# Altium integrated library Altium_Library_Harish.IntLib: 425 symbols (part 1 of 4) (continued)
## CAP_NOT-MOUNTED_0201
designator C?, comment DNP  (no BOM)
Do Not Place this Capacitor 0201; Manufacturer: KEMET; Manufacturer Part Number: C0603C103K8RACTU; Dielectric Material: Ceramic; Capacitance: 10nF; Tolerance: 10%; Voltage Rating: 10V; Dielectric: X7R; Dissipation Factor: 5%; Case/Package: 0603; Supplier-1: Digikey; Supplier 1: Mouser; Manufacturer 1: KEMET; Manufacturer Part Number 1: C0603C103K8RACTU; RoHS: Yes; Category: Ceramic Capacitors; Stock 1: 6134; Pricing 1: 1=0.1, 10=0.034, 50=0.034, 100=0.02, 1000=0.016, 10000=0.011 (USD); Mount: Surface Mount; Case Code (Metric): 1608; Case Code (Imperial): 0603; Min Operating Temperature: -55°C; Max Operating Temperature: 125°C; Package Quantity: 1; Packaging: Tape and Reel; Voltage Rating (DC): 10V; Termination: SMD/SMT; Series: -; Construction: Flat; Length: 1.6mm; Width: 0.031inch; Height: 0.8mm; Thickness: 0.034inch; Lead Pitch: 0.7mm; Depth: 0.8mm; Reach SVHC Compliant: No; ComponentLink1URL: https://datasheet.ciiva.com/49516/1564916-49516523.pdf?src-supplier=Jameco; ComponentLink1Description: https://datasheet.ciiva.com/49516/1564916-49516523.pdf?src-supplier=Jameco; Supplier Part Number 1: 80-C0603C103K8R
footprint CAP_0201
pins: 1, 2

## CAP_NOT-MOUNTED_0402
designator C?, comment DNP  (no BOM)
Do Not Place this Capacitor 0402; Manufacturer: KEMET; Manufacturer Part Number: C0603C103K8RACTU; Dielectric Material: Ceramic; Capacitance: 10nF; Tolerance: 10%; Voltage Rating: 10V; Dielectric: X7R; Dissipation Factor: 5%; Case/Package: 0603; Supplier-1: Digikey; Supplier 1: Mouser; Manufacturer 1: KEMET; Manufacturer Part Number 1: C0603C103K8RACTU; RoHS: Yes; Category: Ceramic Capacitors; Stock 1: 6134; Pricing 1: 1=0.1, 10=0.034, 50=0.034, 100=0.02, 1000=0.016, 10000=0.011 (USD); Mount: Surface Mount; Case Code (Metric): 1608; Case Code (Imperial): 0603; Min Operating Temperature: -55°C; Max Operating Temperature: 125°C; Package Quantity: 1; Packaging: Tape and Reel; Voltage Rating (DC): 10V; Termination: SMD/SMT; Series: -; Construction: Flat; Length: 1.6mm; Width: 0.031inch; Height: 0.8mm; Thickness: 0.034inch; Lead Pitch: 0.7mm; Depth: 0.8mm; Reach SVHC Compliant: No; ComponentLink1URL: https://datasheet.ciiva.com/49516/1564916-49516523.pdf?src-supplier=Jameco; ComponentLink1Description: https://datasheet.ciiva.com/49516/1564916-49516523.pdf?src-supplier=Jameco; Supplier Part Number 1: 80-C0603C103K8R
footprint CAP_0402
pins: 1, 2

## CAP_NOT-MOUNTED_0603
designator C?, comment DNP  (no BOM)
Do Not Place this Capacitor 0603; Manufacturer: KEMET; Manufacturer Part Number: C0603C103K8RACTU; Dielectric Material: Ceramic; Capacitance: 10nF; Tolerance: 10%; Voltage Rating: 10V; Dielectric: X7R; Dissipation Factor: 5%; Case/Package: 0603; Supplier-1: Digikey; Supplier 1: Mouser; Manufacturer 1: KEMET; Manufacturer Part Number 1: C0603C103K8RACTU; RoHS: Yes; Category: Ceramic Capacitors; Stock 1: 6134; Pricing 1: 1=0.1, 10=0.034, 50=0.034, 100=0.02, 1000=0.016, 10000=0.011 (USD); Mount: Surface Mount; Case Code (Metric): 1608; Case Code (Imperial): 0603; Min Operating Temperature: -55°C; Max Operating Temperature: 125°C; Package Quantity: 1; Packaging: Tape and Reel; Voltage Rating (DC): 10V; Termination: SMD/SMT; Series: -; Construction: Flat; Length: 1.6mm; Width: 0.031inch; Height: 0.8mm; Thickness: 0.034inch; Lead Pitch: 0.7mm; Depth: 0.8mm; Reach SVHC Compliant: No; ComponentLink1URL: https://datasheet.ciiva.com/49516/1564916-49516523.pdf?src-supplier=Jameco; ComponentLink1Description: https://datasheet.ciiva.com/49516/1564916-49516523.pdf?src-supplier=Jameco; Supplier Part Number 1: 80-C0603C103K8R
footprint CAP_0603
pins: 1, 2

## CAP_NOT-MOUNTED_0805
designator C?, comment DNP  (no BOM)
Do Not Place this Capacitor 0805; Manufacturer: KEMET; Manufacturer Part Number: C0603C103K8RACTU; Dielectric Material: Ceramic; Capacitance: 10nF; Tolerance: 10%; Voltage Rating: 10V; Dielectric: X7R; Dissipation Factor: 5%; Case/Package: 0603; Supplier-1: Digikey; Supplier 1: Mouser; Manufacturer 1: KEMET; Manufacturer Part Number 1: C0603C103K8RACTU; RoHS: Yes; Category: Ceramic Capacitors; Stock 1: 6134; Pricing 1: 1=0.1, 10=0.034, 50=0.034, 100=0.02, 1000=0.016, 10000=0.011 (USD); Mount: Surface Mount; Case Code (Metric): 1608; Case Code (Imperial): 0603; Min Operating Temperature: -55°C; Max Operating Temperature: 125°C; Package Quantity: 1; Packaging: Tape and Reel; Voltage Rating (DC): 10V; Termination: SMD/SMT; Series: -; Construction: Flat; Length: 1.6mm; Width: 0.031inch; Height: 0.8mm; Thickness: 0.034inch; Lead Pitch: 0.7mm; Depth: 0.8mm; Reach SVHC Compliant: No; ComponentLink1URL: https://datasheet.ciiva.com/49516/1564916-49516523.pdf?src-supplier=Jameco; ComponentLink1Description: https://datasheet.ciiva.com/49516/1564916-49516523.pdf?src-supplier=Jameco; Supplier Part Number 1: 80-C0603C103K8R
footprint CAP_0805
pins: 1, 2

## CAP_NOT-MOUNTED_1206
designator C?, comment DNP  (no BOM)
Do Not Place this Capacitor 1206; Manufacturer: KEMET; Manufacturer Part Number: C0603C103K8RACTU; Dielectric Material: Ceramic; Capacitance: 10nF; Tolerance: 10%; Voltage Rating: 10V; Dielectric: X7R; Dissipation Factor: 5%; Case/Package: 0603; Supplier-1: Digikey; Supplier 1: Mouser; Manufacturer 1: KEMET; Manufacturer Part Number 1: C0603C103K8RACTU; RoHS: Yes; Category: Ceramic Capacitors; Stock 1: 6134; Pricing 1: 1=0.1, 10=0.034, 50=0.034, 100=0.02, 1000=0.016, 10000=0.011 (USD); Mount: Surface Mount; Case Code (Metric): 1608; Case Code (Imperial): 0603; Min Operating Temperature: -55°C; Max Operating Temperature: 125°C; Package Quantity: 1; Packaging: Tape and Reel; Voltage Rating (DC): 10V; Termination: SMD/SMT; Series: -; Construction: Flat; Length: 1.6mm; Width: 0.031inch; Height: 0.8mm; Thickness: 0.034inch; Lead Pitch: 0.7mm; Depth: 0.8mm; Reach SVHC Compliant: No; ComponentLink1URL: https://datasheet.ciiva.com/49516/1564916-49516523.pdf?src-supplier=Jameco; ComponentLink1Description: https://datasheet.ciiva.com/49516/1564916-49516523.pdf?src-supplier=Jameco; Supplier Part Number 1: 80-C0603C103K8R
footprint CAP_1206
pins: 1, 2

## CAP_NOT-MOUNTED_1210
designator C?, comment DNP  (no BOM)
Do Not Place this Capacitor 1210; Manufacturer: KEMET; Manufacturer Part Number: C0603C103K8RACTU; Dielectric Material: Ceramic; Capacitance: 10nF; Tolerance: 10%; Voltage Rating: 10V; Dielectric: X7R; Dissipation Factor: 5%; Case/Package: 0603; Supplier-1: Digikey; Supplier 1: Mouser; Manufacturer 1: KEMET; Manufacturer Part Number 1: C0603C103K8RACTU; RoHS: Yes; Category: Ceramic Capacitors; Stock 1: 6134; Pricing 1: 1=0.1, 10=0.034, 50=0.034, 100=0.02, 1000=0.016, 10000=0.011 (USD); Mount: Surface Mount; Case Code (Metric): 1608; Case Code (Imperial): 0603; Min Operating Temperature: -55°C; Max Operating Temperature: 125°C; Package Quantity: 1; Packaging: Tape and Reel; Voltage Rating (DC): 10V; Termination: SMD/SMT; Series: -; Construction: Flat; Length: 1.6mm; Width: 0.031inch; Height: 0.8mm; Thickness: 0.034inch; Lead Pitch: 0.7mm; Depth: 0.8mm; Reach SVHC Compliant: No; ComponentLink1URL: https://datasheet.ciiva.com/49516/1564916-49516523.pdf?src-supplier=Jameco; ComponentLink1Description: https://datasheet.ciiva.com/49516/1564916-49516523.pdf?src-supplier=Jameco; Supplier Part Number 1: 80-C0603C103K8R
footprint CAP_1210
pins: 1, 2

## COM_MSIM_7POS_CUI
designator J?, comment MSIM-1-A
Memory Card Connectors 7 Positions, Push In, Auto Eject Out, SMT, 1.37 mm Height Above Board,; ComponentLink1Description: LCSC Link; ComponentLink1URL: https://www.lcsc.com/product-detail/SIM-Card-Connectors_SHOU-HAN-MICRO-SIM-7P-H1-35_C7529381.html
footprint CON_MSIM_7POS (MSIM-1-A)
pins: 1 VCC, 2 RST, 3 CLK, 5 GND, 6 VPP, 7 I/O, 8 CD, 9 GND

## CON_ED_2_1mm_SMD Molex - 202396-0207
designator J?, comment 202396-0207  (value not drawn)
Conn Shrouded Header (4 Sides) HDR 2 POS 1mm Solder RA Side Entry SMD Pico-Clasp™ T/R; Manufacturer: Molex; Supplier 1: Mouser; Manufacturer Part Number: 202396-0207; RoHS: No; Category: Headers and Wire Housings; Stock 1: 10886; Pricing 1: 1=0.97, 10=0.804, 50=0.804, 100=0.664, 1000=0.63, 10000=0.435 (USD); ComponentLink1URL: http://datasheet.octopart.com/2023960207-Molex-datasheet-147952241.pdf?src-supplier=Avnet; ComponentLink1Description: http://datasheet.octopart.com/2023960207-Molex-datasheet-147952241.pdf?src-supplier=Avnet; ComponentLink2URL: http://datasheet.octopart.com/2023960207-Molex-datasheet-147952241.pdf?src-supplier=Farnell; ComponentLink2Description: http://datasheet.octopart.com/2023960207-Molex-datasheet-147952241.pdf?src-supplier=Farnell; ComponentLink3URL: http://datasheet.octopart.com/2023960207-Molex-datasheet-147952241.pdf?src-supplier=Digi-Key; ComponentLink3Description: http://datasheet.octopart.com/2023960207-Molex-datasheet-147952241.pdf?src-supplier=Digi-Key; ComponentLink4URL: https://www.molex.com/pdm_docs/sd/2023960207_sd.pdf?src-supplier=Digi-Key; ComponentLink4Description: https://www.molex.com/pdm_docs/sd/2023960207_sd.pdf?src-supplier=Digi-Key; ComponentLink5URL: http://datasheet.octopart.com/2023960207-Molex-datasheet-147952241.pdf?src-supplier=Arrow+Electronics; ComponentLink5Description: http://datasheet.octopart.com/2023960207-Molex-datasheet-147952241.pdf?src-supplier=Arrow+Electronics; ComponentLink6URL: http://datasheet.octopart.com/2023960207-Molex-datasheet-147952241.pdf?src-supplier=Newark; ComponentLink6Description: http://datasheet.octopart.com/2023960207-Molex-datasheet-147952241.pdf?src-supplier=Newark; ComponentLink7URL: https://datasheet.octopart.com/202396-0207-Molex-datasheet-134623761.pdf?src-supplier=TME; ComponentLink7Description: https://datasheet.octopart.com/202396-0207-Molex-datasheet-134623761.pdf?src-supplier=TME; ComponentLink8URL: http://datasheet.octopart.com/2023960207-Molex-datasheet-147952241.pdf?src-supplier=TTI; ComponentLink8Description: http://datasheet.octopart.com/2023960207-Molex-datasheet-147952241.pdf?src-supplier=TTI; ComponentLink9URL: http://datasheet.octopart.com/2023960207-Molex-datasheet-147952241.pdf?src-supplier=Electro+Sonic; ComponentLink9Description: http://datasheet.octopart.com/2023960207-Molex-datasheet-147952241.pdf?src-supplier=Electro+Sonic; ComponentLink10URL: https://datasheet.octopart.com/202396-0207-Molex-datasheet-154746674.pdf?src-supplier=Master+Electronics; ComponentLink10Description: https://datasheet.octopart.com/202396-0207-Molex-datasheet-154746674.pdf?src-supplier=Master+Electronics; Supplier 2: Digi-Key; Manufacturer 2: Molex; Manufacturer Part Number 2: 202396-0207; Stock 2: 70949; Pricing 2: 1=0.97, 10=0.804, 100=0.6698 (USD); Supplier Part Number 2: WM26783CT-ND
footprint CON_ED_2Pos_1mm_SMD_Molex 202396-207
pins: 1 A, 2 B

## CON_ED_3pos_TH Phoenix Contact 1757488
designator J?  (value not drawn)
Terminal Block, Header, 3Pos, R/a, Th Rohs Compliant: Yes; Manufacturer: Phoenix Contact; Manufacturer Part Number: 1757488; Supplier 1: Digi-Key; RoHS: Yes; Category: Terminal Blocks; Stock 1: 1964; Pricing 1: 1=1.08, 10=1.031, 50=0.9864, 100=0.9596, 250=0.8968, 500=0.82508, 1000=0.76229, 2500=0.72864 (USD); ComponentLink1URL: https://datasheet.ciiva.com/16096/1757488-16096446.pdf?src-supplier=Onlinecomponents.com; ComponentLink1Description: https://datasheet.ciiva.com/16096/1757488-16096446.pdf?src-supplier=Onlinecomponents.com; ComponentLink2URL: https://datasheet.ciiva.com/15197/getdatasheetpartid-198276-15197344.pdf?src-supplier=Verical; ComponentLink2Description: https://datasheet.ciiva.com/15197/getdatasheetpartid-198276-15197344.pdf?src-supplier=Verical; ComponentLink3URL: https://datasheet.ciiva.com/795/1757488-795423.pdf?src-supplier=Digi-Key; ComponentLink3Description: https://datasheet.ciiva.com/795/1757488-795423.pdf?src-supplier=Digi-Key; ComponentLink4URL: https://datasheet.ciiva.com/29208/566851-da-01-en-grundgehaeuse-1757488-250-st-29208080.pdf?src-supplier=Conrad; ComponentLink4Description: https://datasheet.ciiva.com/29208/566851-da-01-en-grundgehaeuse-1757488-250-st-29208080.pdf?src-supplier=Conrad; Supplier 2: Digi-Key; Manufacturer 2: Phoenix Contact; Manufacturer Part Number 2: 1757488; Stock 2: 1636; Pricing 2: 1=1.08, 10=1.031, 50=0.9864, 100=0.9596, 250=0.8968, 500=0.82508, 1000=0.76229, 2500=0.72864 (USD); Supplier Part Number 2: 277-1118-ND
footprint CON_ED_3Pos_TH Phoenix Contact 1757488
pins: 1 13, 2 14, 3 15

## CON_ED_4_1mm_SMD Molex - 202396-0407
designator J?  (value not drawn)
Conn Shrouded Header (4 Sides) HDR 4 POS 1mm Solder RA SMD Pico-Clasp™ T/R; Manufacturer: Molex; Manufacturer Part Number: 202396-0407; Supplier 1: Mouser; RoHS: No; Category: Headers and Wire Housings; Stock 1: 53379; Pricing 1: 1=1.14, 10=0.932, 50=0.932, 100=0.795, 1000=0.739, 10000=0.47 (USD); ComponentLink1URL: http://datasheet.octopart.com/202396-0407-Molex-datasheet-134623761.pdf?src-supplier=Verical; ComponentLink1Description: http://datasheet.octopart.com/202396-0407-Molex-datasheet-134623761.pdf?src-supplier=Verical; ComponentLink2URL: https://www.molex.com/pdm_docs/sd/2023960407_sd.pdf?src-supplier=Digi-Key; ComponentLink2Description: https://www.molex.com/pdm_docs/sd/2023960407_sd.pdf?src-supplier=Digi-Key; ComponentLink3URL: http://datasheet.octopart.com/202396-0407-Molex-datasheet-134623761.pdf?src-supplier=Farnell; ComponentLink3Description: http://datasheet.octopart.com/202396-0407-Molex-datasheet-134623761.pdf?src-supplier=Farnell; ComponentLink4URL: http://datasheet.octopart.com/202396-0407-Molex-datasheet-134623761.pdf?src-supplier=Mouser; ComponentLink4Description: http://datasheet.octopart.com/202396-0407-Molex-datasheet-134623761.pdf?src-supplier=Mouser; ComponentLink5URL: http://datasheet.octopart.com/202396-0407-Molex-datasheet-134623761.pdf?src-supplier=Avnet; ComponentLink5Description: http://datasheet.octopart.com/202396-0407-Molex-datasheet-134623761.pdf?src-supplier=Avnet; ComponentLink6URL: http://datasheet.octopart.com/202396-0407-Molex-datasheet-134623761.pdf?src-supplier=Newark; ComponentLink6Description: http://datasheet.octopart.com/202396-0407-Molex-datasheet-134623761.pdf?src-supplier=Newark; ComponentLink7URL: http://datasheet.octopart.com/202396-0407-Molex-datasheet-134623761.pdf?src-supplier=Digi-Key; ComponentLink7Description: http://datasheet.octopart.com/202396-0407-Molex-datasheet-134623761.pdf?src-supplier=Digi-Key; ComponentLink8URL: http://datasheet.octopart.com/202396-0407-Molex-datasheet-134623761.pdf?src-supplier=Onlinecomponents.com; ComponentLink8Description: http://datasheet.octopart.com/202396-0407-Molex-datasheet-134623761.pdf?src-supplier=Onlinecomponents.com; ComponentLink9URL: http://datasheet.octopart.com/202396-0407-Molex-datasheet-134623761.pdf?src-supplier=Electro+Sonic; ComponentLink9Description: http://datasheet.octopart.com/202396-0407-Molex-datasheet-134623761.pdf?src-supplier=Electro+Sonic; ComponentLink10URL: http://datasheet.octopart.com/202396-0407-Molex-datasheet-134623761.pdf?src-supplier=Heilind+Electronics; ComponentLink10Description: http://datasheet.octopart.com/202396-0407-Molex-datasheet-134623761.pdf?src-supplier=Heilind+Electronics; ComponentLink11URL: https://datasheet.octopart.com/202396-0407-Molex-datasheet-154746675.pdf?src-supplier=Master+Electronics; ComponentLink11Description: https://datasheet.octopart.com/202396-0407-Molex-datasheet-154746675.pdf?src-supplier=Master+Electronics; ComponentLink12URL: https://datasheet.octopart.com/202396-0407-Molex-datasheet-134623761.pdf?src-supplier=TME; ComponentLink12Description: https://datasheet.octopart.com/202396-0407-Molex-datasheet-134623761.pdf?src-supplier=TME; Supplier 2: Digi-Key; Manufacturer 2: Molex; Manufacturer Part Number 2: 202396-0407; Stock 2: 11088; Pricing 2: 1=1.05, 10=0.869, 100=0.7238 (USD); Supplier Part Number 2: WM26785CT-ND
footprint CON_ED_4Pos_1mm_SMD_Molex 202396-407
pins: 1 GND, 2 SDA, 3 SCL, 4 VCC

## CON_ED_BATT_3pos_TH
designator J?, comment Battery Connector
Connector Header Surface Mount, Right Angle 3 position 0.047" (1.20mm); Manufacturer 1: JST; Manufacturer Part Number 1: BM03B-ACHSS-GAN-TF; Supplier 1: Digi-Key; RoHS: No; Category: Connectors; Stock 1: 71629; Pricing 1: 1=0.71, 10=0.615, 100=0.5073, 500=0.44112, 1000=0.36393 (USD); Supplier Part Number 1: 455-BM03B-ACHSS-GAN-TFCT-ND
footprint CON_ED_Battery_3POS (Connector Header Surface Mount, Right Angle 3 position 0.047" (1.20mm))
pins: 1 13, 2 14, 3 15

## CON_RJ45 CRJ007-MLG-TH
designator J?  (value not drawn)
RJ jack, 1 port, 8P8C, gold flash, sheild, spring tabs, Y/G LED, magnetic; Manufacturer 1: CUI Devices; Manufacturer Part Number 1: CRJ007-MLG-TH; Supplier 1: Digi-Key; RoHS: No; Category: Modular / Ethernet Connectors; Stock 1: 783; Pricing 1: 1=7.76, 10=7.013, 25=6.6256, 40=6.464, 80=6.14075, 230=5.49439, 700=5.1712, 1400=4.5248 (USD); Supplier Part Number 1: 2223-CRJ007-MLG-TH-ND
footprint CON_RJ45 CRJ007-MLG-TH
pins: 1 TRD0+, 2 TRD0-, 3 TRD1+, 4 TRD1-, 5 P5, 6 P6, 7 TRD2+, 8 TRD2-, 9 TRD3+, 10 TRD3-, 11, 12, 13, 14, S1 SHIELD, S2 SHIELD
text: YL; GN

## CON_RJ45 CRJ011-ML3-TH
designator J?  (value not drawn)
10/100 BaseT, 8P8C, Single Port, Horizontal, Shielded, LED, Through Hole, RJ45 with Integrated Magnetics Modular...; Manufacturer: CUI Devices; Manufacturer Part Number: CRJ011-ML3-TH; Supplier 1: Digi-Key; RoHS: No; Category: Modular / Ethernet Connectors; Stock 1: 390; Pricing 1: 1=5.48, 10=4.975, 25=4.712, 40=4.6025, 80=4.38338, 230=3.83548, 440=3.72589, 1200=3.17797, 2400=2.9588 (USD); Supplier 2: Digi-Key; Manufacturer 2: CUI Devices; Manufacturer Part Number 2: CRJ011-ML3-TH; Stock 2: 380; Pricing 2: 1=5.48, 10=4.975, 25=4.712, 40=4.6025, 80=4.38338, 230=3.83548, 440=3.72589, 1200=3.17797, 2400=2.9588 (USD); Supplier Part Number 2: 2223-CRJ011-ML3-TH-ND
footprint CON_RJ45 CRJ011-ML3-TH
pins: 9, 10, 11, 12, P1 TD+, P2 TD-, P3 RD+, P4, P5, P6 RD-, P7 NC, P8, S1 SHIELD, S2 SHIELD
text: YL; GN

## CON_RJ45_CRJ005-M1-TH
designator J?  (value not drawn)
CRJ005 Series 8 Position Single Port Right Angle RJ45 Through Hole Modular Jack; Manufacturer: CUI Devices; Manufacturer Part Number: CRJ005-M1-TH; Supplier 1: Digi-Key; RoHS: No; Stock 1: 1456; Pricing 1: 1=5.73, 10=5.204, 25=4.9292, 40=4.81475, 80=4.58538, 230=4.01222, 440=3.89759, 1500=3.20978, 3000=3.09515 (USD); Supplier 2: Digi-Key; Manufacturer 2: CUI Devices; Manufacturer Part Number 2: CRJ005-M1-TH; Stock 2: 1456; Pricing 2: 1=5.73, 10=5.204, 25=4.9292, 40=4.81475, 80=4.58538, 230=4.01222, 440=3.89759, 1500=3.20978, 3000=3.09515 (USD); Supplier Part Number 2: 2223-CRJ005-M1-TH-ND
footprint CON_RJ45_TH
pins: 1 TD+, 2 TD-, 3 CT, 4, 5, 6, 7 RD+, 8 RD-, 9 Vc+, 10 Vc-, S1 SHIELD, S2 SHIELD

## CON_SD-Card_TF_card_H1.8_Push_Pull_SMD
designator J?, comment MSD-4-A
Memory Card Connectors 9 Positions, Push In, Auto Eject Out, SMT, 1.8 mm Height Above Board,; Manufacturer: SHOU HAN; Manufacturer Part Number: TF-CARDH1.8; ComponentLink6URL: https://datasheet.ciiva.com/683/1040310811-sd-683581.pdf?src-supplier=Digi-Key; ComponentLink6Description: https://datasheet.ciiva.com/683/1040310811-sd-683581.pdf?src-supplier=Digi-Key; ComponentLink7URL: https://datasheet.ciiva.com/15174/getdatasheetpartid-716154-15174887.pdf?src-supplier=Verical; ComponentLink7Description: https://datasheet.ciiva.com/15174/getdatasheetpartid-716154-15174887.pdf?src-supplier=Verical; Supplier: LCSC; Supplier Part Number: C7529389; RoHS: No; Category: Uncategorized; Stock: 1616; Pricing: 1=0.35, 10=0.348, 25=0.3408, 50=0.3204, 100=0.2727, 250=0.25224, 500=0.24544 (USD)
footprint CON_SD_CARD_9POS_1.1mm-P_1ROW (MSD-4-A / TF-CARD-H1.8)
pins: 1 DAT2 (io), 2 CD/DAT3 (io), 3 CMD (io), 4 Vdd (power), 5 CLK (in), 6 Vss (power), 7 DAT0 (io), 8 DAT1 (io), 9 Cd, 10 GND

## CON_SIM_MOLEX_0786463001_SMD
designator J?, comment 0786463001
PCB Connector, 6 Contact(s), 2 Row(s), Male, Right Angle, Surface Mount Terminal, Locking, Black Insulator, Socket; Manufacturer: Molex; Manufacturer Part Number: 78646-3001; Supplier: Digi-Key; Supplier Part Number: WM9364CT-ND; RoHS: Yes; Category: Memory Connectors; Stock: 261350; Pricing: 1=1.27, 10=1.048, 100=0.8736 (USD); ComponentLink1URL: https://datasheet.ciiva.com/4581/0786463001-memory-card-socket-152580-4581070.pdf?src-supplier=Mouser; ComponentLink1Description: https://datasheet.ciiva.com/4581/0786463001-memory-card-socket-152580-4581070.pdf?src-supplier=Mouser; ComponentLink2URL: https://datasheet.ciiva.com/24490/525020786463001-memory-card-socket-24490529.pdf?src-supplier=Onlinecomponents.com; ComponentLink2Description: https://datasheet.ciiva.com/24490/525020786463001-memory-card-socket-24490529.pdf?src-supplier=Onlinecomponents.com; ComponentLink3URL: https://datasheet.ciiva.com/16655/0786463001-memory-card-socket-16655172.pdf?; ComponentLink3Description: https://datasheet.ciiva.com/16655/0786463001-memory-card-socket-16655172.pdf?
footprint SIM_SOCKET_0786463001_MOLEX (0786463001)
pins: 1 VCC, 2 RST, 3 CLK, 5 GND, 6 VPP, 7 I/O, G1 GND, G2 GND, G3 GND, X1, X2

## CON_USB-A_4POS
designator J?
footprint CON_USB_TYPE-A
pins: 1 V+, 2 D-, 3 D+, 4 GND

## CON_USB-C (2.0)_USB4105-GF-A
designator J?  (value not drawn)
Conn USB 2.0 Type C RCP 24 POS 0.3mm/0.5mm Solder RA SMD 24 Terminal 1 Port T/R; Manufacturer 1: Global Connector Technology; Manufacturer Part Number 1: USB4105-GF-A; Gender: Receptacle; Mating Cycles: 10000; Shielding: Shielded; Number of Ports: 1; ComponentLink1URL: https://gct.co/files/drawings/usb4105.pdf?src-supplier=Digi-Key; ComponentLink1Description: https://gct.co/files/drawings/usb4105.pdf?src-supplier=Digi-Key; ComponentLink2URL: https://datasheet.octopart.com/USB4105-GF-A-GCT-datasheet-166929323.pdf?src-supplier=TME; ComponentLink2Description: https://datasheet.octopart.com/USB4105-GF-A-GCT-datasheet-166929323.pdf?src-supplier=TME; Supplier 1: Farnell; RoHS: No; Category: USB Connectors; Pricing 1: 1=0.72, 20=0.559, 60=0.522, 160=0.443, 400=0.434 (GBP); Mount: Surface Mount,Through Hole,Horizontal; Contact Plating: Gold; Insulation Color: Black; Min Operating Temperature: -40°C; Max Operating Temperature: 85°C; Connector Type: USB; Series: USB4105; Termination: Solder; Flammability Rating: UL94 V-0; Supplier Part Number 1: 3588205
footprint CON_USB_TYPE-C-2.0 SMD TH
pins: A1_B12 GND, A4_B9 VBUS, A5 CC1 (io), A6 DP1 (io), A7 DN1 (io), A8 SBU1 (io), B1_A12 GND, B4_A9 VBUS, B5 CC2 (io), B6 DP2 (io), B7 DN2 (io), B8 SBU2 (io), S1 SHELL_GND, S2 SHELL_GND, S3 SHELL_GND, S4 SHELL_GND

## DIO-S_20V_10A_DO-219AB
designator D?, comment SS2FH10HM3/H
Rectifier Diode, Schottky, 1 Phase, 1 Element, 2A, 100V V(RRM), Silicon, DO-219AB; Manufacturer: Vishay Semiconductors; Package Body Material: Plastic; Application(s): GENERAL PURPOSE; Forward Voltage: 860mV; Non-rep Pk Forward Current-Max: 50A; Number of Elements: 1; Max Reverse Current: 5uA; Reference Standard: AEC-Q101; Supplier: Digikey; Supplier Part Number: SS2FH10HM3/HGICT-ND; Manufacturer Part Number: SS2FH10HM3/H; RoHS: Yes; Category: Rectifier Diodes; Stock: 20427; Pricing: 1=0.42, 10=0.325, 100=0.1953, 500=0.1808, 1000=0.12294 (USD); Pins: 2; Diode Element Material: SILICON; Package Shape: Rectangular; Terminal Finish: Tin; Min Operating Temperature: -55°C; Max Operating Temperature: 175°C; JESD-609 Code: e3; Diode Type: RECTIFIER; JESD-30 Code: R-PDSO-F2; Moisture Sensitivity Level: 1; Number of Phases: 1; Max Output current: 2A; Package Style: SMALL OUTLINEMeter; Rep Pk Reverse Voltage-Max: 100V; Surface Mount: Yes; Technology: SCHOTTKY; Terminal Form: Flat; Terminal Position: DUAL; JEDEC-95 Code: DO-219AB; RoHS Compliant: Yes; ComponentLink1URL: https://datasheet.ciiva.com:443/pdfs/VipMasterIC/IC/VISH/VISH-S-A0006279306/VISH-S-A0006279306-1.pdf?src-supplier=IHS+Markit; ComponentLink1Description: https://datasheet.ciiva.com:443/pdfs/VipMasterIC/IC/VISH/VISH-S-A0006279306/VISH-S-A0006279306-1.pdf?src-supplier=IHS+Markit; ComponentLink2URL: http://www.mouser.com/ds/2/427/ss2fh10-935254.pdf?src-supplier=Mouser; ComponentLink2Description: http://www.mouser.com/ds/2/427/ss2fh10-935254.pdf?src-supplier=Mouser; ComponentLink3URL: http://www.vishay.com/docs/87749/ss2fh10.pdf?src-supplier=Digikey; ComponentLink3Description: http://www.vishay.com/docs/87749/ss2fh10.pdf?src-supplier=Digikey
footprint DO-219AB
pins: 1, 2

## DIO-S_60V_5A_DO-214AB
designator D?, comment B560C-13-F
Rectifier Diode, Schottky, 1 Phase, 1 Element, 5A, 60V V(RRM), Silicon; Manufacturer: Diodes; Package Body Material: Plastic; Time @ Peak Reflow Temperature-Max (s): 40s; Application(s): EFFICIENCY; Non-rep Pk Forward Current-Max: 100A; Number of Elements: 1; Forward Voltage: 700mV; Qualification Status: Not Qualified; Supplier: Digi-Key; Supplier Part Number: B560C-FDICT-ND; Manufacturer Part Number: B560C-13-F; RoHS: Yes; Category: Rectifier Diodes; Stock: 7154; Pricing: 1=0.51, 10=0.436, 100=0.3033, 500=0.2368, 1000=0.19248 (USD); Pins: 2; Package Shape: Rectangular; Terminal Finish: Tin; Diode Element Material: SILICON; Min Operating Temperature: -55°C; Max Operating Temperature: 125°C; JESD-609 Code: e3; JESD-30 Code: R-PDSO-C2; Moisture Sensitivity Level: 1; Package Style: SMALL OUTLINEMeter; Peak Reflow Temperature (Cel): 260°C; Surface Mount: Yes; Technology: SCHOTTKY; Terminal Form: C BEND; Terminal Position: DUAL; Diode Type: RECTIFIER; Number of Phases: 1; Max Output current: 5A; Rep Pk Reverse Voltage-Max: 60V; RoHS Compliant: Yes; Reach SVHC Compliant: No; ComponentLink1URL: https://datasheet.ciiva.com:443/pdfs/VipMasterIC/IC/DIOD/DIOD-S-A0007810469/DIOD-S-A0007810469-1.pdf?src-supplier=IHS+Markit; ComponentLink1Description: https://datasheet.ciiva.com:443/pdfs/VipMasterIC/IC/DIOD/DIOD-S-A0007810469/DIOD-S-A0007810469-1.pdf?src-supplier=IHS+Markit; ComponentLink2URL: https://datasheet.ciiva.com/27052/1538961-27052355.pdf?src-supplier=Jameco; ComponentLink2Description: https://datasheet.ciiva.com/27052/1538961-27052355.pdf?src-supplier=Jameco; ComponentLink3URL: https://datasheet.ciiva.com/1177/ds13012-1177532.pdf?src-supplier=Element14; ComponentLink3Description: https://datasheet.ciiva.com/1177/ds13012-1177532.pdf?src-supplier=Element14; ComponentLink4URL: https://datasheet.ciiva.com/914/ds13012-914985.pdf?src-supplier=Digi-Key; ComponentLink4Description: https://datasheet.ciiva.com/914/ds13012-914985.pdf?src-supplier=Digi-Key; ComponentLink5URL: https://datasheet.ciiva.com/914/ds13012-914986.pdf?src-supplier=Digi-Key; ComponentLink5Description: https://datasheet.ciiva.com/914/ds13012-914986.pdf?src-supplier=Digi-Key; ComponentLink6URL: https://datasheet.ciiva.com/914/ds13012-914987.pdf?src-supplier=Digi-Key; ComponentLink6Description: https://datasheet.ciiva.com/914/ds13012-914987.pdf?src-supplier=Digi-Key; ComponentLink7URL: https://datasheet.ciiva.com/16389/ds13012-16389735.pdf?src-supplier=Future+Electronics; ComponentLink7Description: https://datasheet.ciiva.com/16389/ds13012-16389735.pdf?src-supplier=Future+Electronics; ComponentLink8URL: https://datasheet.ciiva.com/15144/getdatasheetpartid-89786-15144652.pdf?src-supplier=Verical; ComponentLink8Description: https://datasheet.ciiva.com/15144/getdatasheetpartid-89786-15144652.pdf?src-supplier=Verical
footprint DO-214AB SMC
pins: 1, 2

## DIO-S_200V_10A_DPAK
designator D?, comment SBRD10200
Diode Schottky 200V 10A Dpak; Manufacturer: Sangdest Microelectronics; Supplier: Digikey; Supplier Part Number: 1655-SBRD10200CT-ND; Manufacturer Part Number: SBRD10200; RoHS: No; Category: Uncategorized; Stock: 46636; Pricing: 1=0.54, 10=0.461, 100=0.3204, 500=0.25014, 1000=0.20331 (USD)
footprint DPAK - TO-252
pins: 1,3 1, 4

## DIO-S_340mV-Vf_20V-Vr_1A-If_SOD123W
designator D?, comment PMEG2010ER,115  (value not drawn)
DIODE SCHOTTKY 20V 1A SOD123W; Manufacturer 1: Nexperia; ComponentLink1URL: http://www.farnell.com/datasheets/1383341.pdf?src-supplier=Farnell; ComponentLink1Description: http://www.farnell.com/datasheets/1383341.pdf?src-supplier=Farnell; ComponentLink2URL: https://datasheet.octopart.com/PMEG2010ER%2C115-Nexperia-datasheet-8325837.pdf?src-supplier=Newark; ComponentLink2Description: https://datasheet.octopart.com/PMEG2010ER%2C115-Nexperia-datasheet-8325837.pdf?src-supplier=Newark; ComponentLink3URL: http://www.farnell.com/datasheets/1383341.pdf?src-supplier=Element14; ComponentLink3Description: http://www.farnell.com/datasheets/1383341.pdf?src-supplier=Element14; Supplier 1: Digi-Key; Manufacturer Part Number 1: PMEG2010ER,115; RoHS: Yes; Category: Rectifier Diodes; Stock 1: 184921; Pricing 1: 1=0.41, 10=0.308, 100=0.1919, 500=0.1313, 1000=0.101 (USD); Supplier Part Number 1: 1727-5192-1-ND
footprint SOD-123W
pins: 1, 2

## DIO-S_530mV-Vf_60V-Vr_2A_SOD123W
designator D?, comment PMEG6020ER,115
Rectifier Diode, Schottky, 1 Phase, 1 Element, 2A, 60V V(RRM), Silicon; Manufacturer: Nexperia; Supplier 1: Digi-Key; Supplier Part Number 1: 1727-5217-1-ND; Manufacturer Part Number: PMEG6020ER,115; RoHS: Yes; Category: Rectifier Diodes; Stock 1: 174398; Pricing 1: 1=0.38, 10=0.306, 100=0.2081, 500=0.1561, 1000=0.11708 (USD); ComponentLink1URL: http://www.farnell.com/datasheets/609333.pdf?src-supplier=Farnell; ComponentLink1Description: http://www.farnell.com/datasheets/609333.pdf?src-supplier=Farnell; ComponentLink2URL: https://datasheet.octopart.com/PMEG6020ER%2C115-Nexperia-datasheet-8825633.pdf?src-supplier=Newark; ComponentLink2Description: https://datasheet.octopart.com/PMEG6020ER%2C115-Nexperia-datasheet-8825633.pdf?src-supplier=Newark; ComponentLink3URL: http://www.farnell.com/datasheets/609333.pdf?src-supplier=Newark; ComponentLink3Description: http://www.farnell.com/datasheets/609333.pdf?src-supplier=Newark; ComponentLink4URL: https://assets.nexperia.com/documents/data-sheet/PMEG6020ER.pdf?src-supplier=Digi-Key; ComponentLink4Description: https://assets.nexperia.com/documents/data-sheet/PMEG6020ER.pdf?src-supplier=Digi-Key; ComponentLink5URL: https://datasheet.octopart.com/PMEG6020ER%2C115-Nexperia-datasheet-81455721.pdf?src-supplier=TME; ComponentLink5Description: https://datasheet.octopart.com/PMEG6020ER%2C115-Nexperia-datasheet-81455721.pdf?src-supplier=TME; Supplier 2: Future Electronics; Stock 2: 303000; Pricing 2: 3000=0.0783, 9000=0.0753, 15000=0.0739, 30000=0.0721, 60000=0.0694 (USD); RoHS Compliant: Yes; Manufacturer 1: Nexperia; Manufacturer Part Number 1: PMEG6020ER,115; Supplier 3: Digi-Key; Manufacturer 3: Nexperia; Manufacturer Part Number 3: PMEG6020ER,115; Stock 3: 174398; Pricing 3: 1=0.38, 10=0.306, 100=0.2081, 500=0.1561, 1000=0.11708 (USD); Supplier Part Number 3: 1727-5217-6-ND
footprint SOD-123W
pins: 1, 2

## DIO-S_550mV-Vf_30V-Vr_1A-If_SOD323
designator D?, comment BAT760-7
VR=30V IF=1A 25pF P=235mW; Manufacturer 1: Diodes; ComponentLink1URL: https://datasheet.ciiva.com/8301/ds30498-8301400.pdf?src-supplier=Avnet; ComponentLink1Description: https://datasheet.ciiva.com/8301/ds30498-8301400.pdf?src-supplier=Avnet; ComponentLink2URL: https://datasheet.ciiva.com/4715/ds30498-63155-4715521.pdf?src-supplier=Mouser; ComponentLink2Description: https://datasheet.ciiva.com/4715/ds30498-63155-4715521.pdf?src-supplier=Mouser; ComponentLink3URL: https://datasheet.ciiva.com/1178/ds30498-1178033.pdf?src-supplier=Element14; ComponentLink3Description: https://datasheet.ciiva.com/1178/ds30498-1178033.pdf?src-supplier=Element14; ComponentLink4URL: https://datasheet.ciiva.com/914/ds30498-914551.pdf?src-supplier=Digi-Key; ComponentLink4Description: https://datasheet.ciiva.com/914/ds30498-914551.pdf?src-supplier=Digi-Key; ComponentLink5URL: https://datasheet.ciiva.com/914/ds30498-914552.pdf?src-supplier=Digi-Key; ComponentLink5Description: https://datasheet.ciiva.com/914/ds30498-914552.pdf?src-supplier=Digi-Key; ComponentLink6URL: https://datasheet.ciiva.com/914/ds30498-914553.pdf?src-supplier=Digi-Key; ComponentLink6Description: https://datasheet.ciiva.com/914/ds30498-914553.pdf?src-supplier=Digi-Key; ComponentLink7URL: https://datasheet.ciiva.com/22695/1670989-22695799.pdf?src-supplier=Element14; ComponentLink7Description: https://datasheet.ciiva.com/22695/1670989-22695799.pdf?src-supplier=Element14; Supplier 1: Digi-Key; Manufacturer Part Number 1: BAT760-7; RoHS: Yes; Category: Rectifier Diodes; Stock 1: 5345; Pricing 1: 1=0.53, 10=0.454, 100=0.3394, 500=0.26664, 1000=0.20604 (USD); Supplier Part Number 1: BAT760DICT-ND
footprint SOD323 BAT760-7
pins: 1, 2

## DIO-SEN-TSOP57238TT1-Remote Sensor
designator SEN?, comment TSOP57238TT1
TSOP57238TT1; 38kHz IR Receiver +/-75 deg; 40m Range; 2.5V - 5V; SMT; 3.95x3.95x0.8mm; Manufacturer: Vishay Semiconductors; Max Supply Voltage: 5.5V; Output Current: 5mA; Viewing Angle: 75°; Operating Supply Current: 700uA; Power Dissipation: 10mW; Supplier 1: Digikey; Manufacturer Part Number: TSOP57238TT1; RoHS: Yes; Category: Optical Sensors; Stock 1: 7638; Pricing 1: 1=2.02, 10=1.347, 100=1.0369, 500=0.93728 (USD); Mount: Surface Mount; Case/Package: TSOP; Number of Pins: 8; Min Operating Temperature: -25°C; Max Operating Temperature: 85°C; Packaging: Tape and Reel; Min Supply Voltage: 2.5V; Sensing Distance: 40m; Orientation: Top View; Series: -; Supply Current: 5mA; Length: 3.95mm; Width: 3.95mm; Height: 0.8mm; Radiation Hardening: No; RoHS Compliant: Yes; Reach SVHC Compliant: Unknown; ComponentLink1URL: https://datasheet.ciiva.com/8078/tsop572-8078160.pdf?src-supplier=Element14; ComponentLink1Description: https://datasheet.ciiva.com/8078/tsop572-8078160.pdf?src-supplier=Element14; ComponentLink2URL: https://datasheet.ciiva.com/2798/tsop572-2798630.pdf?src-supplier=Digikey; ComponentLink2Description: https://datasheet.ciiva.com/2798/tsop572-2798630.pdf?src-supplier=Digikey; Supplier Part Number 1: TSOP57238TT1CT-ND
footprint TSOP578
pins: 1 OUT, 5 Vin, 6 GND, 8 GND

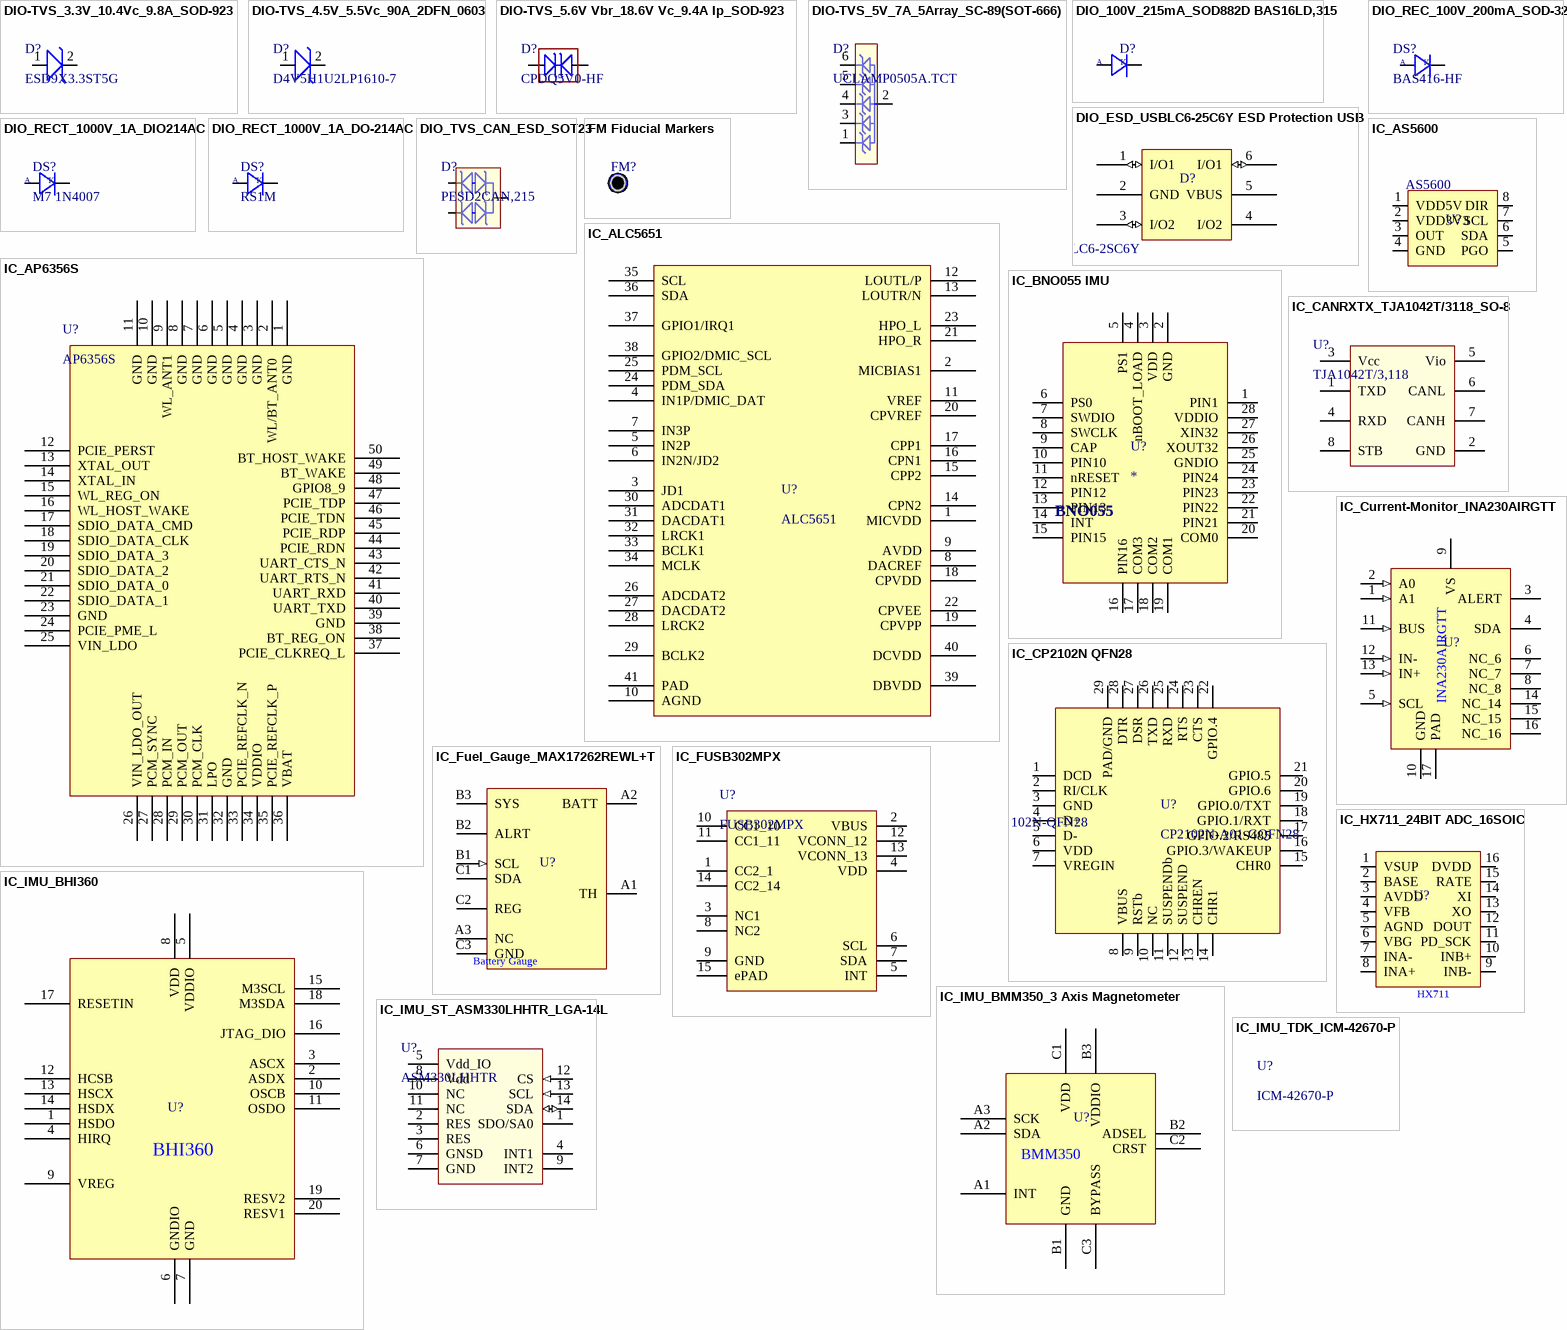
[diagram p3: symbols DIO-TVS_3.3V_10.4Vc_9.8A_SOD-923 to IC_IMU_TDK_ICM-42670-P]

## DIO-TVS_3.3V_10.4Vc_9.8A_SOD-923
designator D?, comment ESD9X3.3ST5G
Trans Voltage Suppressor Diode, 102W, 3.3V V(RWM), Unidirectional, 1 Element, Silicon; Manufacturer: ON Semiconductor; Package Body Material: Plastic; Min Breakdown Voltage: 5V; Number of Elements: 1; Clamping Voltage-Max: 10.4V; Max Power Dissipation: 150mW; Time @ Peak Reflow Temperature-Max (s): 40s; Qualification Status: Not Qualified; Supplier: Digi-Key; Supplier Part Number: ESD9X3.3ST5GOSCT-ND; Manufacturer Part Number: ESD9X3.3ST5G; RoHS: Yes; Category: ESD and Circuit Protection ICs; Stock: 3511; Pricing: 1=0.28, 10=0.193, 100=0.0942, 500=0.07858, 1000=0.0546, 2000=0.04732 (USD); Pins: 2; Diode Element Material: SILICON; Package Shape: Rectangular; Terminal Finish: Tin; Min Operating Temperature: -55°C; Max Operating Temperature: 150°C; Polarity: Unidirectional; Diode Type: TRANS VOLTAGE SUPPRESSOR; Package Style: SMALL OUTLINEMeter; Surface Mount: Yes; Technology: AVALANCHE; Terminal Form: Flat; Terminal Position: DUAL; JESD-609 Code: e3; JESD-30 Code: R-PDSO-F2; Moisture Sensitivity Level: 1; Rep Pk Reverse Voltage-Max: 3.3V; Peak Reflow Temperature (Cel): 260°C; Non-rep Peak Rev Power Dis-Max: 102W; Reach SVHC Compliant: Yes; RoHS Compliant: Yes; ComponentLink1URL: https://datasheet.ciiva.com:443/pdfs/VipMasterIC/IC/ONSM/ONSM-S-A0003579749/ONSM-S-A0003579749-1.pdf?src-supplier=IHS+Markit; ComponentLink1Description: https://datasheet.ciiva.com:443/pdfs/VipMasterIC/IC/ONSM/ONSM-S-A0003579749/ONSM-S-A0003579749-1.pdf?src-supplier=IHS+Markit
pins: 1, 2

## DIO-TVS_4.5V_5.5Vc_90A_2DFN_0603
designator D?, comment D4V5H1U2LP1610-7
11.5V Clamp 90A (8/20µs) Ipp Tvs Diode Surface Mount U-DFN1610-2 (Type B); Manufacturer: Diodes; Diode Type: TRANS VOLTAGE SUPPRESSOR; Supplier: Digi-Key; Supplier Part Number: D4V5H1U2LP1610-7DIDKR-ND; Manufacturer Part Number: D4V5H1U2LP1610-7; RoHS: Yes; Category: TVS Diodes; Stock: 77071; Pricing: 1=0.38, 10=0.272, 100=0.1374, 500=0.12174, 1000=0.09474, 2000=0.08479, 5000=0.0829 (USD); Reach SVHC Compliant: Yes; RoHS Compliant: Yes; ComponentLink1URL: https://datasheet.ciiva.com:443/pdfs/VipMasterIC/IC/DIOD/DIOD-S-A0004145107/DIOD-S-A0004145026-1.pdf?src-supplier=IHS+Markit; ComponentLink1Description: https://datasheet.ciiva.com:443/pdfs/VipMasterIC/IC/DIOD/DIOD-S-A0004145107/DIOD-S-A0004145026-1.pdf?src-supplier=IHS+Markit; Supplier 1: Digi-Key; Supplier Part Number 1: D4V5H1U2LP1610-7DICT-ND
pins: 1, 2

## DIO-TVS_5.6V Vbr_18.6V Vc_9.4A Ip_SOD-923
designator D?, comment CPDQ5V0-HF